# Altium footprint library PCB_Footprints.PcbLib: 303 footprints (part 9 of 19)
Each footprint in its own frame and in the unit in brackets; x right, y up, seen from the top. Pads: shape width x height; smd on the part's side, far side on the other; paste and mask are expansions set on the pad; w line width, h text height; cw(c..) or ccw(c..) is an arc to the next point about the centre after c.
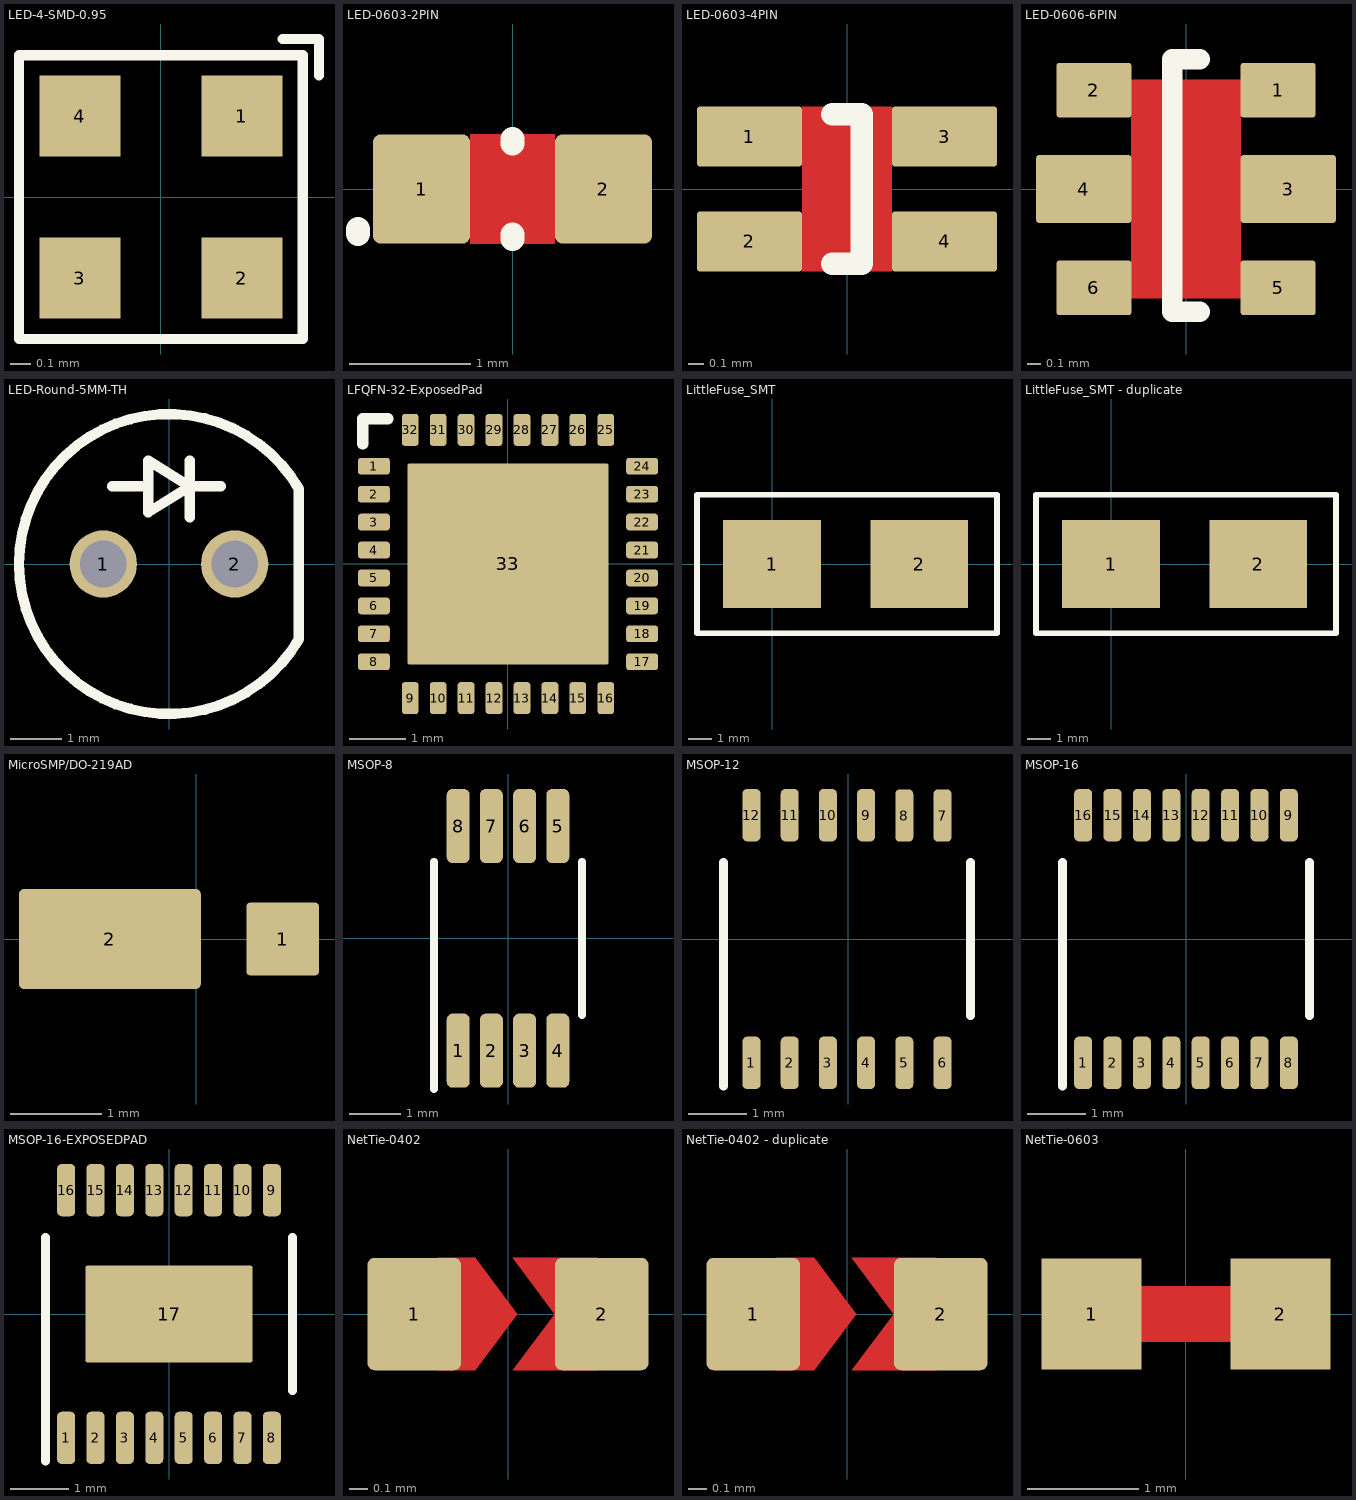
[diagram p8: the footprints below, top view; thin cyan lines are the x and y axes]

## LED-4-SMD-0.95 [mm]
pads (4):
  rect 0.4x0.4 smd: 1(0.4,0.4) 2(0.4,-0.4) 3(-0.4,-0.4) 4(-0.4,0.4)
Top Overlay:
  lines w0.05: 0.7,0.78 0.6,0.78 0.78,0.78 0.78,0.6 ; -0.7,-0.7 0.7,-0.7 0.7,0.7 -0.4,0.7 -0.7,0.7 -0.7,-0.7
3D body: height 0.65, standoff 0, extent -0.52,-0.52 0.51,0.53

## LED-0603-2PIN [mm] "Metric 1608, EIA 0603. Per Yageo Product Specification V2.2"
height 1
pads (2):
  rrect15% 0.8x0.9 smd: 1(-0.75,0) 2(0.75,0)
Top Layer:
  pour cut-out: -0.35,0.45 0.35,0.45 0.35,-0.45 -0.35,-0.45
Top Overlay:
  lines w0.2: -1.275,-0.369 -1.275,-0.331 ; 0,-0.413 0,-0.375 ; 0,0.375 0,0.413
3D body "User Library-Cap_0603.step": height 0.81, standoff -0.01, extent -0.93,-0.412 0.93,0.413

## LED-0603-4PIN [mm] "4 PIN 0603 for Bicolor LED, from Avago HSMF-C16x datasheet"
height 0.5
pads (4):
  rrect10% 0.7x0.4 smd: 1(-0.65,0.35) 2(-0.65,-0.35) 3(0.65,0.35) 4(0.65,-0.35)
Top Layer:
  pour cut-out: -0.3,0.55 0.3,0.55 0.3,-0.55 -0.3,-0.55
Top Overlay:
  lines w0.15: -0.1,-0.5 0.1,-0.5 0.1,-0.4 0.1,0.4 0.1,0.5 -0.1,0.5
3D body "User Library-HSMF-C16x.STEP": height 0.5, standoff -0.01, extent -0.8,-0.4 0.8,0.4

## LED-0606-6PIN [mm] "6 PIN 0606 for RGB LED, from Everlight Electronics Co Ltd EAST1616RGBA8 datasheet"
height 0.5
pads (6):
  rrect10% 0.55x0.4 smd: 1(0.675,0.725) 2(-0.675,0.725) 5(0.675,-0.725) 6(-0.675,-0.725)
  rrect10% 0.7x0.5 smd: 3(0.75,0) 4(-0.75,0)
Top Layer:
  pour cut-out: -0.4,0.8 0.4,0.8 0.4,-0.8 -0.4,-0.8
Top Overlay:
  lines w0.15: 0.1,-0.9 -0.1,-0.9 -0.1,-0.4 -0.1,0.4 -0.1,0.95 0.1,0.95
3D body "19-337 (2).STEP": height 0.35, standoff 0, extent -0.8,-0.8 0.8,0.8

## LED-Round-5MM-TH [mm] "LED-Round-5MM-TH"
pads (2):
  round 1.3 hole 0.9: 1(-1.27,0) 2(1.27,0)
Top Overlay:
  lines w0.2: -1.1,1.5 -0.4,1.5 ; 0.4,0.9 0.4,2 ; 1,1.5 0.4,1.5 ; 0.4,1.5 -0.4,1 -0.4,2 0.4,1.5 ; 2.511,-1.45 cw(c0,0) 2.511,1.45 2.511,-1.45
3D body "ALSRobot-LED Red 5mm.STEP": height 12.31, standoff -2.49, extent -2.98,-3.01 2.44,3.01

## LFQFN-32-ExposedPad [mm] "From ADXL313 Datasheet. Rev. C"
height 1.45
pads (33):
  rrect35% 0.57x0.3 smd: 1(-2.4,1.75) 2(-2.4,1.25) 3(-2.4,0.75) 4(-2.4,0.25) 5(-2.4,-0.25) 6(-2.4,-0.75) 7(-2.4,-1.25) 8(-2.4,-1.75) 17(2.4,-1.75) 18(2.4,-1.25) 19(2.4,-0.75) 20(2.4,-0.25) 21(2.4,0.25) 22(2.4,0.75) 23(2.4,1.25) 24(2.4,1.75)
  rrect35% 0.3x0.57 smd: 9(-1.75,-2.4) 10(-1.25,-2.4) 11(-0.75,-2.4) 12(-0.25,-2.4) 13(0.25,-2.4) 14(0.75,-2.4) 15(1.25,-2.4) 16(1.75,-2.4) 25(1.75,2.4) 26(1.25,2.4) 27(0.75,2.4) 28(0.25,2.4) 29(-0.25,2.4) 30(-0.75,2.4) 31(-1.25,2.4) 32(-1.75,2.4)
  rrect2% 3.6x3.6 smd: 33(0,0)
Top Overlay:
  lines w0.2: -2.6,2.15 -2.6,2.6 -2.15,2.6
3D body: height 0.25, standoff 0, extent -2.5,-2.5 2.5,2.5

## LittleFuse_SMT [mil]
pads (2):
  rect 167x150 smd: 1(0,0) 2(251.18,0)
Top Overlay:
  lines w10: -127.95,-118.11 383.86,-118.11 383.86,118.11 -127.95,118.11 -127.95,-118.11

## LittleFuse_SMT - duplicate [mil]
pads (2):
  rect 167x150 smd: 1(0,0) 2(251.18,0)
Top Overlay:
  lines w10: -127.95,-118.11 383.86,-118.11 383.86,118.11 -127.95,118.11 -127.95,-118.11

## MicroSMP/DO-219AD [mm] "DO-219AD / MicroSMP. From Vishay MSX1PB Datasheet, ID 87726, Rev03May2018"
height 0.73
pads (2):
  rrect10% 0.8x0.8 smd: 1(0.95,0)
  rrect10% 2x1.1 smd: 2(-0.95,0)
3D body "User Library-MicroSMP-1.STEP": height 0.67, standoff -0.01, extent -1.55,-0.65 0.95,0.65

## MSOP-8 [mm] "MSOP-8, 0.65mm pitch, Microchip C04-2111A"
height 1.1
pads (8):
  rrect50% 0.45x1.45 smd: 1(-0.975,-2.2) 2(-0.325,-2.2) 3(0.325,-2.2) 4(0.975,-2.2) 5(0.975,2.2) 6(0.325,2.2) 7(-0.325,2.2) 8(-0.975,2.2)
Top Overlay:
  lines w0.15: -1.45,-2.95 -1.45,1.5 ; 1.45,-1.5 1.45,1.5
3D body "User Library-EMSOP-8 Natl Semi MUY08A.step": height 1.09, standoff -0.01, extent -1.5,-2.5 1.5,2.5

## MSOP-12 [mm] "MSOP-12, 0.50mm pitch, Reference LTC DWG # 05-08-1669 Rev Ø"
height 1.1
pads (12):
  rrect50% 0.305x0.89 smd: 1(-1.65,-2.107) 2(-1,-2.107) 3(-0.35,-2.107) 4(0.3,-2.107) 5(0.95,-2.107) 6(1.6,-2.107) 7(1.6,2.1) 8(0.95,2.1) 9(0.3,2.107) 10(-0.35,2.107) 11(-1,2.107) 12(-1.65,2.107)
Top Overlay:
  lines w0.15: -2.125,-2.5 -2.125,1.3 ; 2.075,-1.3 2.075,1.3
3D body "User Library-msop-12.STEP": height 1.1, standoff 0, extent -2.045,-2.45 1.995,2.45

## MSOP-16 [mm] "MSOP-16-EP, 0.50mm pitch, Reference LTC DWG # 05-08-1669 Rev Ø"
height 1.1
pads (16):
  rrect50% 0.305x0.89 smd: 1(-1.75,-2.107) 2(-1.25,-2.107) 3(-0.75,-2.107) 4(-0.25,-2.107) 5(0.25,-2.107) 6(0.75,-2.107) 7(1.25,-2.107) 8(1.75,-2.107) 9(1.75,2.107) 10(1.25,2.107) 11(0.75,2.107) 12(0.25,2.107) 13(-0.25,2.107) 14(-0.75,2.107) 15(-1.25,2.107) 16(-1.75,2.107)
Top Overlay:
  lines w0.15: -2.1,-2.5 -2.1,1.3 ; 2.1,-1.3 2.1,1.3
3D body "User Library-MSOP-16.step": height 0.85, standoff -0.01, extent -2.019,-2.45 2.02,2.45

## MSOP-16-EXPOSEDPAD [mm] "MSOP-16-EP, 0.50mm pitch, per Linear MSE drawing 05-08-1667 rev F"
height 1.1
pads (17):
  rrect50% 0.305x0.889 smd: 1(-1.75,-2.107) 2(-1.25,-2.107) 3(-0.75,-2.107) 4(-0.25,-2.107) 5(0.25,-2.107) 6(0.75,-2.107) 7(1.25,-2.107) 8(1.75,-2.107) 9(1.75,2.107) 10(1.25,2.107) 11(0.75,2.107) 12(0.25,2.107) 13(-0.25,2.107) 14(-0.75,2.107) 15(-1.25,2.107) 16(-1.75,2.107)
  rrect5% 2.845x1.651 smd: 17(0,0)
Top Overlay:
  lines w0.15: -2.1,-2.5 -2.1,1.3 ; 2.1,-1.3 2.1,1.3
3D body "User Library-MSOP-16.step": height 0.85, standoff -0.01, extent -2.019,-2.45 2.02,2.45

## NetTie-0402 [mm] "Metric 1005, EIA 0402 Drawn per Yageo \"Chip resistors Mounting\" rev 10"
height 1
pads (2):
  rrect15% 0.5x0.6 smd: 1(-0.5,0) 2(0.5,0)
Top Layer:
  region: 0.475,0.3 0.025,0.3 0.25,0 0.025,-0.3 0.375,-0.3 0.475,-0.3
  region: -0.375,0.3 -0.175,0.3 0.05,0 -0.175,-0.3 -0.375,-0.3
Top Solder:
  rectangle: -0.375,-0.3 0.3,0.3
3D body "User Library-0402(1005M) Res.step": height 0.51, standoff 0, extent -0.508,-0.254 0.508,0.254

## NetTie-0402 - duplicate [mm] "Metric 1005, EIA 0402 Drawn per Yageo \"Chip resistors Mounting\" rev 10"
height 1
pads (2):
  rrect15% 0.5x0.6 smd: 1(-0.5,0) 2(0.5,0)
Top Layer:
  region: 0.475,0.3 0.025,0.3 0.25,0 0.025,-0.3 0.375,-0.3 0.475,-0.3
  region: -0.375,0.3 -0.175,0.3 0.05,0 -0.175,-0.3 -0.375,-0.3
Top Solder:
  rectangle: -0.375,-0.3 0.3,0.3
3D body "User Library-0402(1005M) Res.step": height 0.51, standoff 0, extent -0.508,-0.254 0.508,0.254

## NetTie-0603 [mm] "Net Tie with an EIA 0603 land pattern"
pads (2):
  rect 0.9x1 smd paste-1 mask+0.102: 1(-0.85,0) 2(0.85,0)
Top Layer:
  lines w0.5: -0.85,0 0.85,0